# Altium footprint library CONN_B2B.PcbLib: 30 footprints (part 1 of 2)
Each footprint in its own frame and in the unit in brackets; x right, y up, seen from the top. Pads: shape width x height; smd on the part's side, far side on the other; paste and mask are expansions set on the pad; w line width, h text height; cw(c..) or ccw(c..) is an arc to the next point about the centre after c.
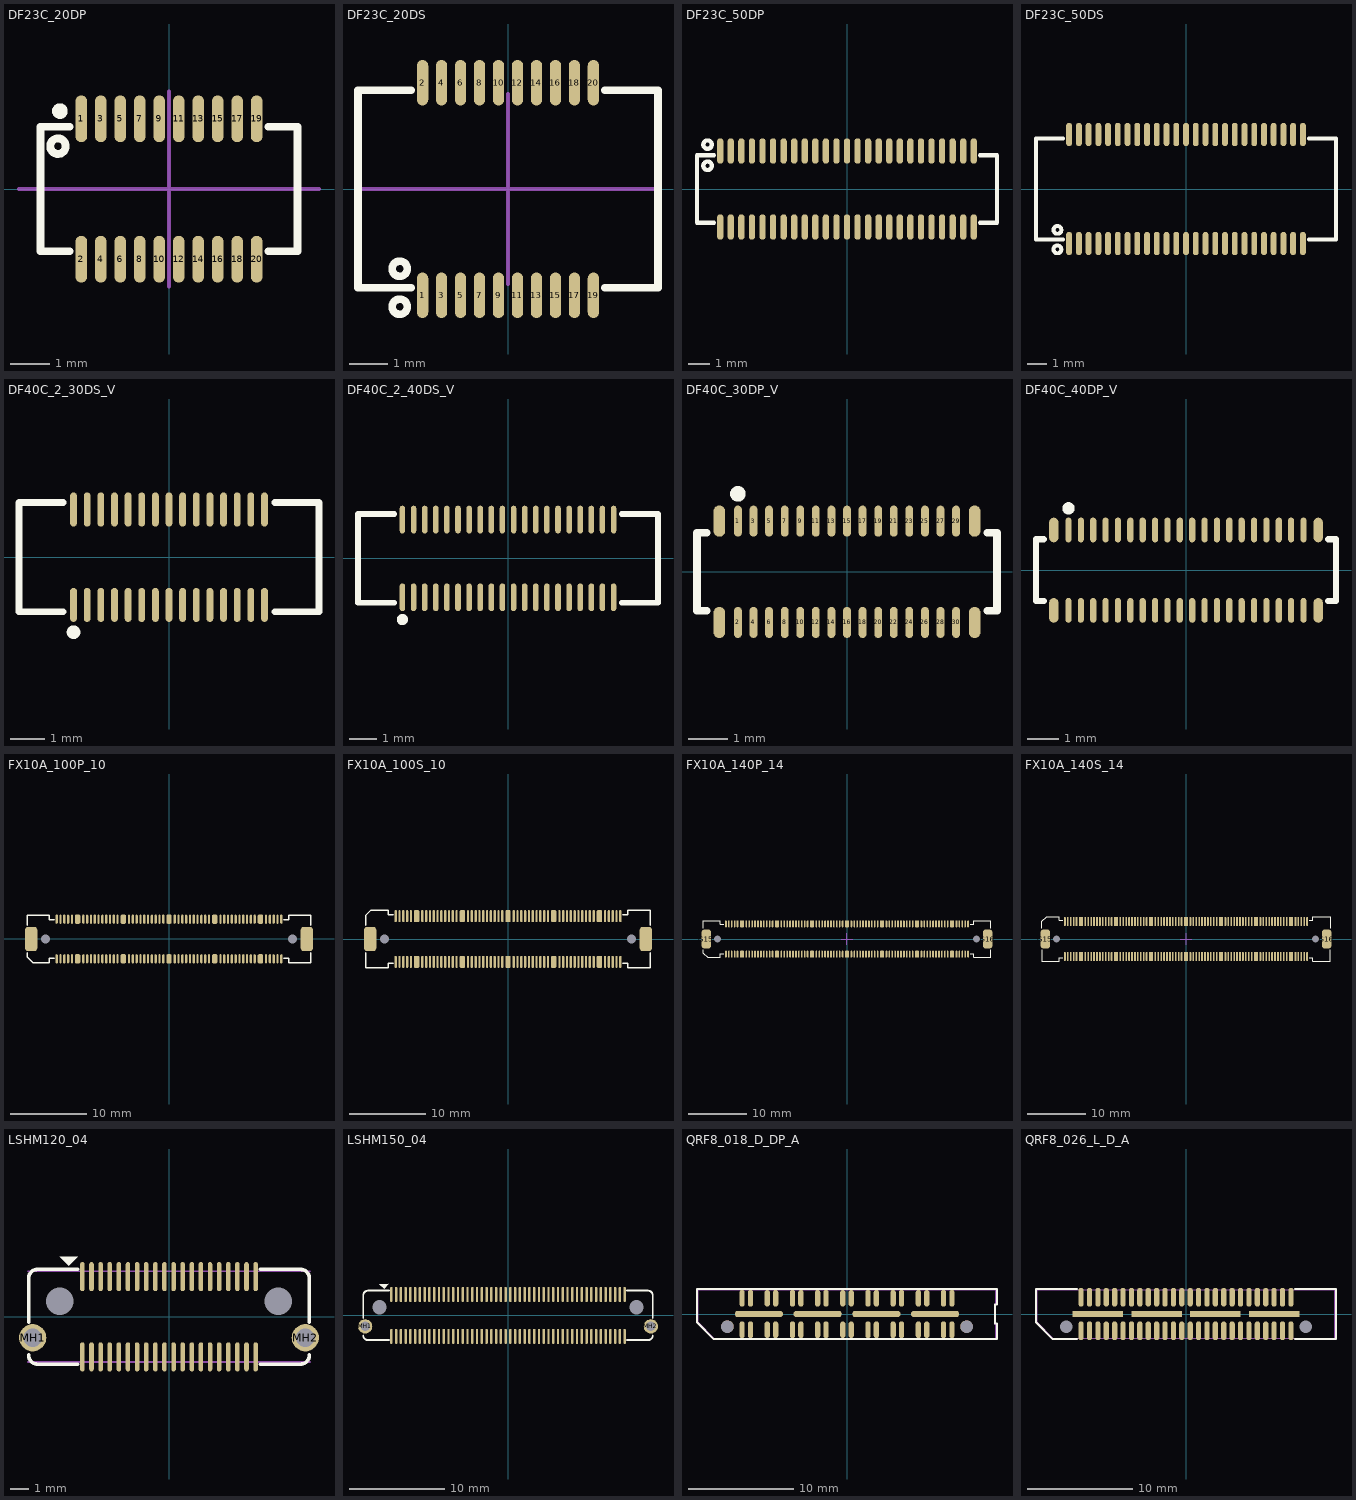
[diagram p0: the footprints below, top view; thin cyan lines are the x and y axes]

## DF23C_20DP [mm] "Hirose Connector DF23C-20DP-0.5V(92) 20WAY pitch:0.5mm"
height 1.5
pads (20):
  oval 0.3x1.2 smd mask+0.075: 1(-2.25,1.8) 2(-2.25,-1.8) 3(-1.75,1.8) 4(-1.75,-1.8) 5(-1.25,1.8) 6(-1.25,-1.8) 7(-0.75,1.8) 8(-0.75,-1.8) 9(-0.25,1.8) 10(-0.25,-1.8) 11(0.25,1.8) 12(0.25,-1.8) 13(0.75,1.8) 14(0.75,-1.8) 15(1.25,1.8) 16(1.25,-1.8) 17(1.75,1.8) 18(1.75,-1.8) 19(2.25,1.8) 20(2.25,-1.8)
Top Overlay:
  circle w0.2: c-2.8,2 r0.1
  circle w0.2: c-2.85,1.1 r0.2
  lines w0.2: -2.55,-1.6 -3.3,-1.6 -3.3,1.6 -2.55,1.6 ; 2.55,-1.6 3.3,-1.6 3.3,1.6 2.55,1.6
Mechanical 13:
  lines w0.1: -3.85,0 3.85,0 ; 0,-2.5 0,2.5
3D body "DF23C-20DP-0.5V.stp": height 1.2, standoff 0, extent -3.25,-2.15 3.25,2.15

## DF23C_20DS [mm] "Hirose Connector DF23C-20DS-0.5V(51) 20WAY pitch:0.5mm"
height 1.5
pads (20):
  oval 0.3x1.2 smd mask+0.075: 1(-2.25,-2.8) 2(-2.25,2.8) 3(-1.75,-2.8) 4(-1.75,2.8) 5(-1.25,-2.8) 6(-1.25,2.8) 7(-0.75,-2.8) 8(-0.75,2.8) 9(-0.25,-2.8) 10(-0.25,2.8) 11(0.25,-2.8) 12(0.25,2.8) 13(0.75,-2.8) 14(0.75,2.8) 15(1.25,-2.8) 16(1.25,2.8) 17(1.75,-2.8) 18(1.75,2.8) 19(2.25,-2.8) 20(2.25,2.8)
Top Overlay:
  circle w0.2: c-2.85,-3.1 r0.2
  circle w0.2: c-2.85,-2.1 r0.2
  lines w0.2: -2.55,-2.6 -3.95,-2.6 -3.95,2.6 -2.55,2.6 ; 2.55,-2.6 3.95,-2.6 3.95,2.6 2.55,2.6
Mechanical 13:
  lines w0.1: -3.85,0 3.85,0 ; 0,-2.5 0,2.5
3D body "DF23C-20DS-0.5V.stp": height 1.42, standoff -0.03, extent -3.8,-3 3.8,3

## DF23C_50DP [mm] "Hirose Connector DF23C-50DP-0.5V(92) 50WAY pitch:0.5mm"
height 1.5
pads (50):
  oval 0.3x1.2 smd mask+0.075: 1(-6,1.8) 2(-6,-1.8) 3(-5.5,1.8) 4(-5.5,-1.8) 5(-5,1.8) 6(-5,-1.8) 7(-4.5,1.8) 8(-4.5,-1.8) 9(-4,1.8) 10(-4,-1.8) 11(-3.5,1.8) 12(-3.5,-1.8) 13(-3,1.8) 14(-3,-1.8) 15(-2.5,1.8) 16(-2.5,-1.8) 17(-2,1.8) 18(-2,-1.8) 19(-1.5,1.8) 20(-1.5,-1.8) 21(-1,1.8) 22(-1,-1.8) 23(-0.5,1.8) 24(-0.5,-1.8) 25(0,1.8) 26(0,-1.8) 27(0.5,1.8) 28(0.5,-1.8) 29(1,1.8) 30(1,-1.8) 31(1.5,1.8) 32(1.5,-1.8) 33(2,1.8) 34(2,-1.8) 35(2.5,1.8) 36(2.5,-1.8) 37(3,1.8) 38(3,-1.8) 39(3.5,1.8) 40(3.5,-1.8) 41(4,1.8) 42(4,-1.8) 43(4.5,1.8) 44(4.5,-1.8) 45(5,1.8) 46(5,-1.8) 47(5.5,1.8) 48(5.5,-1.8) 49(6,1.8) 50(6,-1.8)
Top Overlay:
  circle w0.2: c-6.6,1.1 r0.2
  circle w0.2: c-6.6,2.1 r0.2
  lines w0.2: -6.3,-1.6 -7.1,-1.6 -7.1,1.6 -6.3,1.6 ; 6.3,-1.6 7.1,-1.6 7.1,1.6 6.3,1.6
3D body "DF23C-50DP-0.5V.stp": height 1.2, standoff 0, extent -7,-2.15 7,2.15

## DF23C_50DS [mm] "Hirose Connector DF23C-50DS-0.5V(51) 50WAY pitch:0.5mm"
height 1.5
pads (50):
  oval 0.3x1.2 smd mask+0.075: 1(-6,-2.8) 2(-6,2.8) 3(-5.5,-2.8) 4(-5.5,2.8) 5(-5,-2.8) 6(-5,2.8) 7(-4.5,-2.8) 8(-4.5,2.8) 9(-4,-2.8) 10(-4,2.8) 11(-3.5,-2.8) 12(-3.5,2.8) 13(-3,-2.8) 14(-3,2.8) 15(-2.5,-2.8) 16(-2.5,2.8) 17(-2,-2.8) 18(-2,2.8) 19(-1.5,-2.8) 20(-1.5,2.8) 21(-1,-2.8) 22(-1,2.8) 23(-0.5,-2.8) 24(-0.5,2.8) 25(0,-2.8) 26(0,2.8) 27(0.5,-2.8) 28(0.5,2.8) 29(1,-2.8) 30(1,2.8) 31(1.5,-2.8) 32(1.5,2.8) 33(2,-2.8) 34(2,2.8) 35(2.5,-2.8) 36(2.5,2.8) 37(3,-2.8) 38(3,2.8) 39(3.5,-2.8) 40(3.5,2.8) 41(4,-2.8) 42(4,2.8) 43(4.5,-2.8) 44(4.5,2.8) 45(5,-2.8) 46(5,2.8) 47(5.5,-2.8) 48(5.5,2.8) 49(6,-2.8) 50(6,2.8)
Top Overlay:
  circle w0.2: c-6.6,-2.1 r0.2
  circle w0.2: c-6.6,-3.1 r0.2
  lines w0.2: -6.3,-2.6 -7.7,-2.6 -7.7,2.6 -6.3,2.6 ; 6.3,-2.6 7.7,-2.6 7.7,2.6 6.3,2.6
3D body "DF23C-50DS-0.5V.stp": height 1.42, standoff -0.03, extent -7.55,-3 7.55,3

## DF40C_2_30DS_V [mm] "CONN_DF40C, DF40C(2.0)- 30DS-0.4V(51)"
pads (30):
  oval 0.2x1 smd mask+0.05: 1(-2.8,-1.4) 2(-2.8,1.4) 3(-2.4,-1.4) 4(-2.4,1.4) 5(-2,-1.4) 6(-2,1.4) 7(-1.6,-1.4) 8(-1.6,1.4) 9(-1.2,-1.4) 10(-1.2,1.4) 11(-0.8,-1.4) 12(-0.8,1.4) 13(-0.4,-1.4) 14(-0.4,1.4) 15(0,-1.4) 16(0,1.4) 17(0.4,-1.4) 18(0.4,1.4) 19(0.8,-1.4) 20(0.8,1.4) 21(1.2,-1.4) 22(1.2,1.4) 23(1.6,-1.4) 24(1.6,1.4) 25(2,-1.4) 26(2,1.4) 27(2.4,-1.4) 28(2.4,1.4) 29(2.8,-1.4) 30(2.8,1.4)
Top Overlay:
  circle w0.2: c-2.8,-2.2 r0.1
  lines w0.2: -3.1,-1.6 -4.4,-1.6 -4.4,1.6 -3.1,1.6 ; 3.1,-1.6 4.4,-1.6 4.4,1.6 3.1,1.6
3D body "DF40C(2.0)-30DS-0.4V.stp": height 1.95, standoff 0, extent -4.3,-1.68 4.3,1.7

## DF40C_2_40DS_V [mm] "CONN_DF40C, DF40C(2.0)- 40DS-0.4V(51)"
pads (40):
  oval 0.2x1 smd mask+0.05: 1(-3.8,-1.4) 2(-3.8,1.4) 3(-3.4,-1.4) 4(-3.4,1.4) 5(-3,-1.4) 6(-3,1.4) 7(-2.6,-1.4) 8(-2.6,1.4) 9(-2.2,-1.4) 10(-2.2,1.4) 11(-1.8,-1.4) 12(-1.8,1.4) 13(-1.4,-1.4) 14(-1.4,1.4) 15(-1,-1.4) 16(-1,1.4) 17(-0.6,-1.4) 18(-0.6,1.4) 19(-0.2,-1.4) 20(-0.2,1.4) 21(0.2,-1.4) 22(0.2,1.4) 23(0.6,-1.4) 24(0.6,1.4) 25(1,-1.4) 26(1,1.4) 27(1.4,-1.4) 28(1.4,1.4) 29(1.8,-1.4) 30(1.8,1.4) 31(2.2,-1.4) 32(2.2,1.4) 33(2.6,-1.4) 34(2.6,1.4) 35(3,-1.4) 36(3,1.4) 37(3.4,-1.4) 38(3.4,1.4) 39(3.8,-1.4) 40(3.8,1.4)
Top Overlay:
  circle w0.2: c-3.8,-2.2 r0.1
  lines w0.2: -4.1,-1.6 -5.4,-1.6 -5.4,1.6 -4.1,1.6 ; 4.1,-1.6 5.4,-1.6 5.4,1.6 4.1,1.6
3D body "DF40C(2.0)-40DS-0.4V.stp": height 1.95, standoff 0, extent -5.3,-1.7 5.3,1.68

## DF40C_30DP_V [mm] "CONN_DF40C, DF40C- 30DP-0.4V(51)"
pads (34):
  oval 0.2x0.8 smd mask+0.05: 1(-2.8,1.3) 2(-2.8,-1.3) 3(-2.4,1.3) 4(-2.4,-1.3) 5(-2,1.3) 6(-2,-1.3) 7(-1.6,1.3) 8(-1.6,-1.3) 9(-1.2,1.3) 10(-1.2,-1.3) 11(-0.8,1.3) 12(-0.8,-1.3) 13(-0.4,1.3) 14(-0.4,-1.3) 15(0,1.3) 16(0,-1.3) 17(0.4,1.3) 18(0.4,-1.3) 19(0.8,1.3) 20(0.8,-1.3) 21(1.2,1.3) 22(1.2,-1.3) 23(1.6,1.3) 24(1.6,-1.3) 25(2,1.3) 26(2,-1.3) 27(2.4,1.3) 28(2.4,-1.3) 29(2.8,1.3) 30(2.8,-1.3)
  oval 0.3x0.8 smd mask+0.05: ""(-3.275,-1.3) ""(-3.275,1.3) ""(3.275,-1.3) ""(3.275,1.3)
Top Overlay:
  circle w0.2: c-2.8,2 r0.1
  lines w0.2: -3.6,-1 -3.85,-1 -3.85,1 -3.6,1 ; 3.6,-1 3.85,-1 3.85,1 3.6,1
3D body "DF40C-30DP.stp": height 1.14, standoff 0, extent -3.76,-1.497 3.76,1.473

## DF40C_40DP_V [mm] "CONN_DF40C, DF40C- 40DP-0.4V(51)"
pads (44):
  oval 0.2x0.8 smd mask+0.05: 1(-3.8,1.3) 2(-3.8,-1.3) 3(-3.4,1.3) 4(-3.4,-1.3) 5(-3,1.3) 6(-3,-1.3) 7(-2.6,1.3) 8(-2.6,-1.3) 9(-2.2,1.3) 10(-2.2,-1.3) 11(-1.8,1.3) 12(-1.8,-1.3) 13(-1.4,1.3) 14(-1.4,-1.3) 15(-1,1.3) 16(-1,-1.3) 17(-0.6,1.3) 18(-0.6,-1.3) 19(-0.2,1.3) 20(-0.2,-1.3) 21(0.2,1.3) 22(0.2,-1.3) 23(0.6,1.3) 24(0.6,-1.3) 25(1,1.3) 26(1,-1.3) 27(1.4,1.3) 28(1.4,-1.3) 29(1.8,1.3) 30(1.8,-1.3) 31(2.2,1.3) 32(2.2,-1.3) 33(2.6,1.3) 34(2.6,-1.3) 35(3,1.3) 36(3,-1.3) 37(3.4,1.3) 38(3.4,-1.3) 39(3.8,1.3) 40(3.8,-1.3)
  oval 0.3x0.8 smd mask+0.05: ""(-4.275,-1.3) ""(-4.275,1.3) ""(4.275,-1.3) ""(4.275,1.3)
Top Overlay:
  circle w0.2: c-3.8,2 r0.1
  lines w0.2: -4.6,-1 -4.85,-1 -4.85,1 -4.6,1 ; 4.6,-1 4.85,-1 4.85,1 4.6,1
3D body "DF40C-40DP.stp": height 1.14, standoff 0, extent -4.76,-1.495 4.76,1.475

## FX10A_100P_10 [mm] "FX10A-100P/10-SV(71)"
pads (114):
  oval 0.3x1.2 smd mask+0.05: 1(-14.75,-2.6) 2(-14.75,2.6) 3(-14.25,-2.6) 4(-14.25,2.6) 5(-13.75,-2.6) 6(-13.75,2.6) 7(-13.25,-2.6) 8(-13.25,2.6) 9(-12.75,-2.6) 10(-12.75,2.6) 11(-11.25,-2.6) 12(-11.25,2.6) 13(-10.75,-2.6) 14(-10.75,2.6) 15(-10.25,-2.6) 16(-10.25,2.6) 17(-9.75,-2.6) 18(-9.75,2.6) 19(-9.25,-2.6) 20(-9.25,2.6) 21(-8.75,-2.6) 22(-8.75,2.6) 23(-8.25,-2.6) 24(-8.25,2.6) 25(-7.75,-2.6) 26(-7.75,2.6) 27(-7.25,-2.6) 28(-7.25,2.6) 29(-6.75,-2.6) 30(-6.75,2.6) 31(-5.25,-2.6) 32(-5.25,2.6) 33(-4.75,-2.6) 34(-4.75,2.6) 35(-4.25,-2.6) 36(-4.25,2.6) 37(-3.75,-2.6) 38(-3.75,2.6) 39(-3.25,-2.6) 40(-3.25,2.6) 41(-2.75,-2.6) 42(-2.75,2.6) 43(-2.25,-2.6) 44(-2.25,2.6) 45(-1.75,-2.6) 46(-1.75,2.6) 47(-1.25,-2.6) 48(-1.25,2.6) 49(-0.75,-2.6) 50(-0.75,2.6) 51(0.75,-2.6) 52(0.75,2.6) 53(1.25,-2.6) 54(1.25,2.6) 55(1.75,-2.6) 56(1.75,2.6) 57(2.25,-2.6) 58(2.25,2.6) 59(2.75,-2.6) 60(2.75,2.6) 61(3.25,-2.6) 62(3.25,2.6) 63(3.75,-2.6) 64(3.75,2.6) 65(4.25,-2.6) 66(4.25,2.6) 67(4.75,-2.6) 68(4.75,2.6) 69(5.25,-2.6) 70(5.25,2.6) 71(6.75,-2.6) 72(6.75,2.6) 73(7.25,-2.6) 74(7.25,2.6) 75(7.75,-2.6) 76(7.75,2.6) 77(8.25,-2.6) 78(8.25,2.6) 79(8.75,-2.6) 80(8.75,2.6) 81(9.25,-2.6) 82(9.25,2.6) 83(9.75,-2.6) 84(9.75,2.6) 85(10.25,-2.6) 86(10.25,2.6) 87(10.75,-2.6) 88(10.75,2.6) 89(11.25,-2.6) 90(11.25,2.6) 91(12.75,-2.6) 92(12.75,2.6) 93(13.25,-2.6) 94(13.25,2.6) 95(13.75,-2.6) 96(13.75,2.6) 97(14.25,-2.6) 98(14.25,2.6) 99(14.75,-2.6) 100(14.75,2.6)
  rrect50% 0.7x1.2 smd: G0(-12,-2.6) G1(-12,2.6) G2(-6,-2.6) G3(-6,2.6) G4(0,-2.6) G5(0,2.6) G6(6,-2.6) G7(6,2.6) G8(12,-2.6) G9(12,2.6)
  rrect50% 1.6x3.2 smd mask+0.075: ""(-18.1,0) ""(18.1,0)
  round 0.5 hole 1.2 unplated: ""(-16.2,0) ""(16.2,0)
Top Overlay:
  lines w0.2: -18.6,-1.8 -18.6,-2.4 -17.9,-3.1 -15.7,-3.1 -15.7,-2.5 -15.1,-2.5 ; -18.6,1.8 -18.6,3.1 -15.7,3.1 -15.7,2.5 -15.1,2.5 ; 15.1,-2.5 15.7,-2.5 15.7,-3.1 18.6,-3.1 18.6,-1.8 ; 15.1,2.5 15.7,2.5 15.7,3.1 18.6,3.1 18.6,1.8
3D body "FX10A-100P10-SV.stp": height 3.51, standoff -0.59, extent -18.5,-2.95 18.6,2.95

## FX10A_100S_10 [mm] "FX10A-100S/10-SV(71)"
pads (114):
  oval 0.3x1.6 smd mask+0.05: 1(-14.75,3) 2(-14.75,-3) 3(-14.25,3) 4(-14.25,-3) 5(-13.75,3) 6(-13.75,-3) 7(-13.25,3) 8(-13.25,-3) 9(-12.75,3) 10(-12.75,-3) 11(-11.25,3) 12(-11.25,-3) 13(-10.75,3) 14(-10.75,-3) 15(-10.25,3) 16(-10.25,-3) 17(-9.75,3) 18(-9.75,-3) 19(-9.25,3) 20(-9.25,-3) 21(-8.75,3) 22(-8.75,-3) 23(-8.25,3) 24(-8.25,-3) 25(-7.75,3) 26(-7.75,-3) 27(-7.25,3) 28(-7.25,-3) 29(-6.75,3) 30(-6.75,-3) 31(-5.25,3) 32(-5.25,-3) 33(-4.75,3) 34(-4.75,-3) 35(-4.25,3) 36(-4.25,-3) 37(-3.75,3) 38(-3.75,-3) 39(-3.25,3) 40(-3.25,-3) 41(-2.75,3) 42(-2.75,-3) 43(-2.25,3) 44(-2.25,-3) 45(-1.75,3) 46(-1.75,-3) 47(-1.25,3) 48(-1.25,-3) 49(-0.75,3) 50(-0.75,-3) 51(0.75,3) 52(0.75,-3) 53(1.25,3) 54(1.25,-3) 55(1.75,3) 56(1.75,-3) 57(2.25,3) 58(2.25,-3) 59(2.75,3) 60(2.75,-3) 61(3.25,3) 62(3.25,-3) 63(3.75,3) 64(3.75,-3) 65(4.25,3) 66(4.25,-3) 67(4.75,3) 68(4.75,-3) 69(5.25,3) 70(5.25,-3) 71(6.75,3) 72(6.75,-3) 73(7.25,3) 74(7.25,-3) 75(7.75,3) 76(7.75,-3) 77(8.25,3) 78(8.25,-3) 79(8.75,3) 80(8.75,-3) 81(9.25,3) 82(9.25,-3) 83(9.75,3) 84(9.75,-3) 85(10.25,3) 86(10.25,-3) 87(10.75,3) 88(10.75,-3) 89(11.25,3) 90(11.25,-3) 91(12.75,3) 92(12.75,-3) 93(13.25,3) 94(13.25,-3) 95(13.75,3) 96(13.75,-3) 97(14.25,3) 98(14.25,-3) 99(14.75,3) 100(14.75,-3)
  rrect50% 0.7x1.6 smd: G0(-12,3) G1(-12,-3) G2(-6,3) G3(-6,-3) G4(0,3) G5(0,-3) G6(6,3) G7(6,-3) G8(12,3) G9(12,-3)
  rrect50% 1.6x3.2 smd mask+0.075: ""(-18.1,0) ""(18.1,0)
  round 0.5 hole 1.2 unplated: ""(-16.2,0) ""(16.2,0)
Top Overlay:
  lines w0.2: -18.7,-1.8 -18.7,-3.8 -15.7,-3.8 -15.7,-3.2 -15.1,-3.2 ; -18.7,1.8 -18.7,3.1 -18,3.8 -15.7,3.8 -15.7,3.2 -15.1,3.2 ; 15.1,-3.2 15.7,-3.2 15.7,-3.8 18.7,-3.8 18.7,-1.8 ; 15.1,3.2 15.7,3.2 15.7,3.8 18.7,3.8 18.7,1.8
3D body "FX10A-100S10-SV.stp": height 3.22, standoff -0.58, extent -18.6,-3.65 18.5,3.65

## FX10A_140P_14 [mm] "FX10A-140P/14-SV(71) HIROSE"
height 4
pads (158):
  oval 0.3x1.2 smd mask+0.075: 1(-20.75,-2.6) 2(-20.75,2.6) 3(-20.25,-2.6) 4(-20.25,2.6) 5(-19.75,-2.6) 6(-19.75,2.6) 7(-19.25,-2.6) 8(-19.25,2.6) 9(-18.75,-2.6) 10(-18.75,2.6) 11(-17.25,-2.6) 12(-17.25,2.6) 13(-16.75,-2.6) 14(-16.75,2.6) 15(-16.25,-2.6) 16(-16.25,2.6) 17(-15.75,-2.6) 18(-15.75,2.6) 19(-15.25,-2.6) 20(-15.25,2.6) 21(-14.75,-2.6) 22(-14.75,2.6) 23(-14.25,-2.6) 24(-14.25,2.6) 25(-13.75,-2.6) 26(-13.75,2.6) 27(-13.25,-2.6) 28(-13.25,2.6) 29(-12.75,-2.6) 30(-12.75,2.6) 31(-11.25,-2.6) 32(-11.25,2.6) 33(-10.75,-2.6) 34(-10.75,2.6) 35(-10.25,-2.6) 36(-10.25,2.6) 37(-9.75,-2.6) 38(-9.75,2.6) 39(-9.25,-2.6) 40(-9.25,2.6) 41(-8.75,-2.6) 42(-8.75,2.6) 43(-8.25,-2.6) 44(-8.25,2.6) 45(-7.75,-2.6) 46(-7.75,2.6) 47(-7.25,-2.6) 48(-7.25,2.6) 49(-6.75,-2.6) 50(-6.75,2.6) 51(-5.25,-2.6) 52(-5.25,2.6) 53(-4.75,-2.6) 54(-4.75,2.6) 55(-4.25,-2.6) 56(-4.25,2.6) 57(-3.75,-2.6) 58(-3.75,2.6) 59(-3.25,-2.6) 60(-3.25,2.6) 61(-2.75,-2.6) 62(-2.75,2.6) 63(-2.25,-2.6) 64(-2.25,2.6) 65(-1.75,-2.6) 66(-1.75,2.6) 67(-1.25,-2.6) 68(-1.25,2.6) 69(-0.75,-2.6) 70(-0.75,2.6) 71(0.75,-2.6) 72(0.75,2.6) 73(1.25,-2.6) 74(1.25,2.6) 75(1.75,-2.6) 76(1.75,2.6) 77(2.25,-2.6) 78(2.25,2.6) 79(2.75,-2.6) 80(2.75,2.6) 81(3.25,-2.6) 82(3.25,2.6) 83(3.75,-2.6) 84(3.75,2.6) 85(4.25,-2.6) 86(4.25,2.6) 87(4.75,-2.6) 88(4.75,2.6) 89(5.25,-2.6) 90(5.25,2.6) 91(6.75,-2.6) 92(6.75,2.6) 93(7.25,-2.6) 94(7.25,2.6) 95(7.75,-2.6) 96(7.75,2.6) 97(8.25,-2.6) 98(8.25,2.6) 99(8.75,-2.6) 100(8.75,2.6) 101(9.25,-2.6) 102(9.25,2.6) 103(9.75,-2.6) 104(9.75,2.6) 105(10.25,-2.6) 106(10.25,2.6) 107(10.75,-2.6) 108(10.75,2.6) 109(11.25,-2.6) 110(11.25,2.6) 111(12.75,-2.6) 112(12.75,2.6) 113(13.25,-2.6) 114(13.25,2.6) 115(13.75,-2.6) 116(13.75,2.6) 117(14.25,-2.6) 118(14.25,2.6) 119(14.75,-2.6) 120(14.75,2.6) 121(15.25,-2.6) 122(15.25,2.6) 123(15.75,-2.6) 124(15.75,2.6) 125(16.25,-2.6) 126(16.25,2.6) 127(16.75,-2.6) 128(16.75,2.6) 129(17.25,-2.6) 130(17.25,2.6) 131(18.75,-2.6) 132(18.75,2.6) 133(19.25,-2.6) 134(19.25,2.6) 135(19.75,-2.6) 136(19.75,2.6) 137(20.25,-2.6) 138(20.25,2.6) 139(20.75,-2.6) 140(20.75,2.6)
  rrect50% 0.7x1.2 smd mask+0.075: G1(-18,-2.6) G2(-18,2.6) G3(-12,-2.6) G4(-12,2.6) G5(-6,-2.6) G6(-6,2.6) G7(0,-2.6) G8(0,2.6) G9(6,-2.6) G10(6,2.6) G11(12,-2.6) G12(12,2.6) G13(18,-2.6) G14(18,2.6)
  rrect50% 1.6x3.2 smd mask+0.075: G15(-24.1,0) G16(24.1,0)
  round 0.5 hole 1.2 unplated: ""(-22.2,0) ""(22.2,0)
Top Overlay:
  lines w0.2: -24.6,-1.8 -24.6,-2.4 -23.9,-3.1 -21.7,-3.1 -21.7,-2.5 -21.1,-2.5 ; -24.6,1.8 -24.6,3.1 -21.7,3.1 -21.7,2.5 -21.1,2.5 ; 21.1,-2.5 21.7,-2.5 21.7,-3.1 24.6,-3.1 24.6,-1.8 ; 21.1,2.5 21.7,2.5 21.7,3.1 24.6,3.1 24.6,1.8
Mechanical 13:
  lines w0.1: -1,0 1,0 ; 0,-1 0,1
3D body "FX10A-140P14-SV.stp": height 3.51, standoff -0.59, extent -24.55,-2.95 24.55,2.95

## FX10A_140S_14 [mm] "FX10A-140S/14-SV HIROSE"
height 4
pads (158):
  oval 0.3x1.6 smd mask+0.075: 1(-20.75,3) 2(-20.75,-3) 3(-20.25,3) 4(-20.25,-3) 5(-19.75,3) 6(-19.75,-3) 7(-19.25,3) 8(-19.25,-3) 9(-18.75,3) 10(-18.75,-3) 11(-17.25,3) 12(-17.25,-3) 13(-16.75,3) 14(-16.75,-3) 15(-16.25,3) 16(-16.25,-3) 17(-15.75,3) 18(-15.75,-3) 19(-15.25,3) 20(-15.25,-3) 21(-14.75,3) 22(-14.75,-3) 23(-14.25,3) 24(-14.25,-3) 25(-13.75,3) 26(-13.75,-3) 27(-13.25,3) 28(-13.25,-3) 29(-12.75,3) 30(-12.75,-3) 31(-11.25,3) 32(-11.25,-3) 33(-10.75,3) 34(-10.75,-3) 35(-10.25,3) 36(-10.25,-3) 37(-9.75,3) 38(-9.75,-3) 39(-9.25,3) 40(-9.25,-3) 41(-8.75,3) 42(-8.75,-3) 43(-8.25,3) 44(-8.25,-3) 45(-7.75,3) 46(-7.75,-3) 47(-7.25,3) 48(-7.25,-3) 49(-6.75,3) 50(-6.75,-3) 51(-5.25,3) 52(-5.25,-3) 53(-4.75,3) 54(-4.75,-3) 55(-4.25,3) 56(-4.25,-3) 57(-3.75,3) 58(-3.75,-3) 59(-3.25,3) 60(-3.25,-3) 61(-2.75,3) 62(-2.75,-3) 63(-2.25,3) 64(-2.25,-3) 65(-1.75,3) 66(-1.75,-3) 67(-1.25,3) 68(-1.25,-3) 69(-0.75,3) 70(-0.75,-3) 71(0.75,3) 72(0.75,-3) 73(1.25,3) 74(1.25,-3) 75(1.75,3) 76(1.75,-3) 77(2.25,3) 78(2.25,-3) 79(2.75,3) 80(2.75,-3) 81(3.25,3) 82(3.25,-3) 83(3.75,3) 84(3.75,-3) 85(4.25,3) 86(4.25,-3) 87(4.75,3) 88(4.75,-3) 89(5.25,3) 90(5.25,-3) 91(6.75,3) 92(6.75,-3) 93(7.25,3) 94(7.25,-3) 95(7.75,3) 96(7.75,-3) 97(8.25,3) 98(8.25,-3) 99(8.75,3) 100(8.75,-3) 101(9.25,3) 102(9.25,-3) 103(9.75,3) 104(9.75,-3) 105(10.25,3) 106(10.25,-3) 107(10.75,3) 108(10.75,-3) 109(11.25,3) 110(11.25,-3) 111(12.75,3) 112(12.75,-3) 113(13.25,3) 114(13.25,-3) 115(13.75,3) 116(13.75,-3) 117(14.25,3) 118(14.25,-3) 119(14.75,3) 120(14.75,-3) 121(15.25,3) 122(15.25,-3) 123(15.75,3) 124(15.75,-3) 125(16.25,3) 126(16.25,-3) 127(16.75,3) 128(16.75,-3) 129(17.25,3) 130(17.25,-3) 131(18.75,3) 132(18.75,-3) 133(19.25,3) 134(19.25,-3) 135(19.75,3) 136(19.75,-3) 137(20.25,3) 138(20.25,-3) 139(20.75,3) 140(20.75,-3)
  rrect50% 0.7x1.6 smd mask+0.075: G1(-18,3) G2(-18,-3) G3(-12,3) G4(-12,-3) G5(-6,3) G6(-6,-3) G7(0,3) G8(0,-3) G9(6,3) G10(6,-3) G11(12,3) G12(12,-3) G13(18,3) G14(18,-3)
  rrect50% 1.6x3.2 smd mask+0.075: G15(-24.1,0) G16(24.1,0)
  round 0.5 hole 1.2 unplated: ""(-22.2,0) ""(22.2,0)
Top Overlay:
  lines w0.2: -24.7,-1.8 -24.7,-3.8 -21.7,-3.8 -21.7,-3.2 -21.1,-3.2 ; -24.7,1.8 -24.7,3 -23.9,3.8 -21.7,3.8 -21.7,3.2 -21.1,3.2 ; 21.1,-3.2 21.7,-3.2 21.7,-3.8 24.7,-3.8 24.7,-1.8 ; 21.1,3.2 21.7,3.2 21.7,3.8 24.7,3.8 24.7,1.8
Mechanical 13:
  lines w0.1: -1,0 1,0 ; 0,-1 0,1
3D body "FX10A-140S14-SV.stp": height 3.22, standoff -0.58, extent -24.55,-3.65 24.55,3.65

## LSHM120_04 [mm] "LSHM-120-04.0-L-DV-A-S"
pads (44):
  oval 0.25x1.6 smd mask+0.05: 1(-4.75,2.2) 2(-4.75,-2.2) 3(-4.25,2.2) 4(-4.25,-2.2) 5(-3.75,2.2) 6(-3.75,-2.2) 7(-3.25,2.2) 8(-3.25,-2.2) 9(-2.75,2.2) 10(-2.75,-2.2) 11(-2.25,2.2) 12(-2.25,-2.2) 13(-1.75,2.2) 14(-1.75,-2.2) 15(-1.25,2.2) 16(-1.25,-2.2) 17(-0.75,2.2) 18(-0.75,-2.2) 19(-0.25,2.2) 20(-0.25,-2.2) 21(0.25,2.2) 22(0.25,-2.2) 23(0.75,2.2) 24(0.75,-2.2) 25(1.25,2.2) 26(1.25,-2.2) 27(1.75,2.2) 28(1.75,-2.2) 29(2.25,2.2) 30(2.25,-2.2) 31(2.75,2.2) 32(2.75,-2.2) 33(3.25,2.2) 34(3.25,-2.2) 35(3.75,2.2) 36(3.75,-2.2) 37(4.25,2.2) 38(4.25,-2.2) 39(4.75,2.2) 40(4.75,-2.2)
  round 1.5 hole 1 mask+0.075: MH1(-7.475,-1.15) MH2(7.475,-1.15)
  round 0 hole 1.5 unplated mask+0.1: ""(-6,0.85) ""(6,0.85)
Top Overlay:
  region: -5.507,2.807 -5.014,3.3 -6,3.3
  lines w0.2: -7.7,-2.1 ccw(c-7.2,-2.1) -7.2,-2.6 -5,-2.6 ; -7.7,-0.3 -7.7,2.1 cw(c-7.2,2.1) -7.2,2.6 -5,2.6 ; 5,-2.6 7.2,-2.6 ccw(c7.2,-2.1) 7.7,-2.1 ; 5,2.6 7.2,2.6 cw(c7.2,2.1) 7.7,2.1 7.7,-0.3
Mechanical 13:
  lines w0.1: -7.725,-2.49 7.725,-2.49 ; -7.725,2.49 7.725,2.49
3D body "LSHM-120-04.0-L-DV-A-S-K-TR.stp": height 5.6, standoff -1.65, extent -7.899,-2.49 7.899,2.49

## LSHM150_04 [mm] "LSHM-150-04.0-L-DV-A-S"
pads (104):
  oval 0.25x1.6 smd mask+0.075: 1(-12.25,2.2) 2(-12.25,-2.2) 3(-11.75,2.2) 4(-11.75,-2.2) 5(-11.25,2.2) 6(-11.25,-2.2) 7(-10.75,2.2) 8(-10.75,-2.2) 9(-10.25,2.2) 10(-10.25,-2.2) 11(-9.75,2.2) 12(-9.75,-2.2) 13(-9.25,2.2) 14(-9.25,-2.2) 15(-8.75,2.2) 16(-8.75,-2.2) 17(-8.25,2.2) 18(-8.25,-2.2) 19(-7.75,2.2) 20(-7.75,-2.2) 21(-7.25,2.2) 22(-7.25,-2.2) 23(-6.75,2.2) 24(-6.75,-2.2) 25(-6.25,2.2) 26(-6.25,-2.2) 27(-5.75,2.2) 28(-5.75,-2.2) 29(-5.25,2.2) 30(-5.25,-2.2) 31(-4.75,2.2) 32(-4.75,-2.2) 33(-4.25,2.2) 34(-4.25,-2.2) 35(-3.75,2.2) 36(-3.75,-2.2) 37(-3.25,2.2) 38(-3.25,-2.2) 39(-2.75,2.2) 40(-2.75,-2.2) 41(-2.25,2.2) 42(-2.25,-2.2) 43(-1.75,2.2) 44(-1.75,-2.2) 45(-1.25,2.2) 46(-1.25,-2.2) 47(-0.75,2.2) 48(-0.75,-2.2) 49(-0.25,2.2) 50(-0.25,-2.2) 51(0.25,2.2) 52(0.25,-2.2) 53(0.75,2.2) 54(0.75,-2.2) 55(1.25,2.2) 56(1.25,-2.2) 57(1.75,2.2) 58(1.75,-2.2) 59(2.25,2.2) 60(2.25,-2.2) 61(2.75,2.2) 62(2.75,-2.2) 63(3.25,2.2) 64(3.25,-2.2) 65(3.75,2.2) 66(3.75,-2.2) 67(4.25,2.2) 68(4.25,-2.2) 69(4.75,2.2) 70(4.75,-2.2) 71(5.25,2.2) 72(5.25,-2.2) 73(5.75,2.2) 74(5.75,-2.2) 75(6.25,2.2) 76(6.25,-2.2) 77(6.75,2.2) 78(6.75,-2.2) 79(7.25,2.2) 80(7.25,-2.2) 81(7.75,2.2) 82(7.75,-2.2) 83(8.25,2.2) 84(8.25,-2.2) 85(8.75,2.2) 86(8.75,-2.2) 87(9.25,2.2) 88(9.25,-2.2) 89(9.75,2.2) 90(9.75,-2.2) 91(10.25,2.2) 92(10.25,-2.2) 93(10.75,2.2) 94(10.75,-2.2) 95(11.25,2.2) 96(11.25,-2.2) 97(11.75,2.2) 98(11.75,-2.2) 99(12.25,2.2) 100(12.25,-2.2)
  round 1.5 hole 1: MH1(-15,-1.15) MH2(15,-1.15)
  round 0 hole 1.5 unplated mask+0.1: ""(-13.5,0.85) ""(13.5,0.85)
Top Overlay:
  region: -13.007,2.807 -12.514,3.3 -13.5,3.3
  lines w0.2: -15.2,-2.1 ccw(c-14.7,-2.1) -14.7,-2.6 -12.5,-2.6 ; -15.2,-0.3 -15.2,2.1 cw(c-14.7,2.1) -14.7,2.6 -12.5,2.6 ; 12.5,-2.6 14.7,-2.6 ccw(c14.7,-2.1) 15.2,-2.1 ; 12.5,2.6 14.7,2.6 cw(c14.7,2.1) 15.2,2.1 15.2,-0.3
3D body "LSHM-150-04.0-L-DV-A-S-TR.stp": height 5.45, standoff -1.65, extent -15.399,-2.49 15.399,2.49

## QRF8_018_D_DP_A [mm] "Samtec, QRF8-018-D-DP-A, 0.80 mm Q Rate® High-Speed Ground Plane Slim Body Socket Strip, Differential Pair"
pads (42):
  oval 0.5x1.6 smd mask+0.05: 1(-10,-1.5) 2(-10,1.5) 3(-9.2,-1.5) 4(-9.2,1.5) 5(-7.6,-1.5) 6(-7.6,1.5) 7(-6.8,-1.5) 8(-6.8,1.5) 9(-5.2,-1.5) 10(-5.2,1.5) 11(-4.4,-1.5) 12(-4.4,1.5) 13(-2.8,-1.5) 14(-2.8,1.5) 15(-2,-1.5) 16(-2,1.5) 17(-0.4,-1.5) 18(-0.4,1.5) 19(0.4,-1.5) 20(0.4,1.5) 21(2,-1.5) 22(2,1.5) 23(2.8,-1.5) 24(2.8,1.5) 25(4.4,-1.5) 26(4.4,1.5) 27(5.2,-1.5) 28(5.2,1.5) 29(6.8,-1.5) 30(6.8,1.5) 31(7.6,-1.5) 32(7.6,1.5) 33(9.2,-1.5) 34(9.2,1.5) 35(10,-1.5) 36(10,1.5)
  oval 4.6x0.6 smd mask+0.05: G1(-8.4,0) G2(-2.8,0) G3(2.8,0) G4(8.4,0)
  round 1.2 hole 1.2 unplated mask+0.1: ""(-11.4,-1.2) ""(11.4,-1.2)
Top Overlay:
  lines w0.2: -14.3,-0.8 -12.7,-2.4 14.3,-2.4 14.3,-0.9 14.1,-0.9 14.1,0.9 14.3,0.9 14.3,2.4 -14.3,2.4 -14.3,-0.8
Mechanical 13:
  lines w0.1: -14.185,-0.8 -12.685,-2.3 14.185,-2.3 14.185,-1 14.085,-1 14.085,1 14.185,1 14.185,2.3 -14.185,2.3 -14.185,-0.8
3D body "QRF8-018-05.0-L-D-DP-A.stp": height 6.26, standoff -1.28, extent -14.185,-2.3 14.185,2.3

## QRF8_026_L_D_A [mm] "CONN, B2B, SAMTEC, QRF8, QRF8-026-05.0-L-D-A, 0.80 mm Q Rate® Slim Body Ground Plane Socket"
pads (58):
  oval 0.5x1.8 smd mask+0.05: 1(-10,-1.6) 2(-10,1.6) 3(-9.2,-1.6) 4(-9.2,1.6) 5(-8.4,-1.6) 6(-8.4,1.6) 7(-7.6,-1.6) 8(-7.6,1.6) 9(-6.8,-1.6) 10(-6.8,1.6) 11(-6,-1.6) 12(-6,1.6) 13(-5.2,-1.6) 14(-5.2,1.6) 15(-4.4,-1.6) 16(-4.4,1.6) 17(-3.6,-1.6) 18(-3.6,1.6) 19(-2.8,-1.6) 20(-2.8,1.6) 21(-2,-1.6) 22(-2,1.6) 23(-1.2,-1.6) 24(-1.2,1.6) 25(-0.4,-1.6) 26(-0.4,1.6) 27(0.4,-1.6) 28(0.4,1.6) 29(1.2,-1.6) 30(1.2,1.6) 31(2,-1.6) 32(2,1.6) 33(2.8,-1.6) 34(2.8,1.6) 35(3.6,-1.6) 36(3.6,1.6) 37(4.4,-1.6) 38(4.4,1.6) 39(5.2,-1.6) 40(5.2,1.6) 41(6,-1.6) 42(6,1.6) 43(6.8,-1.6) 44(6.8,1.6) 45(7.6,-1.6) 46(7.6,1.6) 47(8.4,-1.6) 48(8.4,1.6) 49(9.2,-1.6) 50(9.2,1.6) 51(10,-1.6) 52(10,1.6)
  rect 4.8x0.6 smd mask+0.05: G1(-8.4,0) G2(-2.8,0) G3(2.8,0) G4(8.4,0)
  round 0 hole 1.2 unplated: ""(-11.4,-1.2) ""(11.4,-1.2)
Top Overlay:
  lines w0.2: -10.4,-2.4 -12.7,-2.4 -14.3,-0.8 -14.3,2.4 -10.4,2.4 ; 10.4,-2.4 14.3,-2.4 14.3,2.4 10.4,2.4
Mechanical 1:
  lines w0.1: -14.185,-0.8 -14.185,2.3 14.185,2.3 14.185,-2.3 -12.685,-2.3 -14.185,-0.8
3D body "QRF8-026-05.0-L-D-A.stp": height 6.26, standoff -1.28, extent -14.185,-2.3 14.185,2.3